# Altium footprint library ACTION_Connector.PcbLib: 123 footprints (part 6 of 8)
Each footprint in its own frame and in the unit in brackets; x right, y up, seen from the top. Pads: shape width x height; smd on the part's side, far side on the other; paste and mask are expansions set on the pad; w line width, h text height; cw(c..) or ccw(c..) is an arc to the next point about the centre after c.
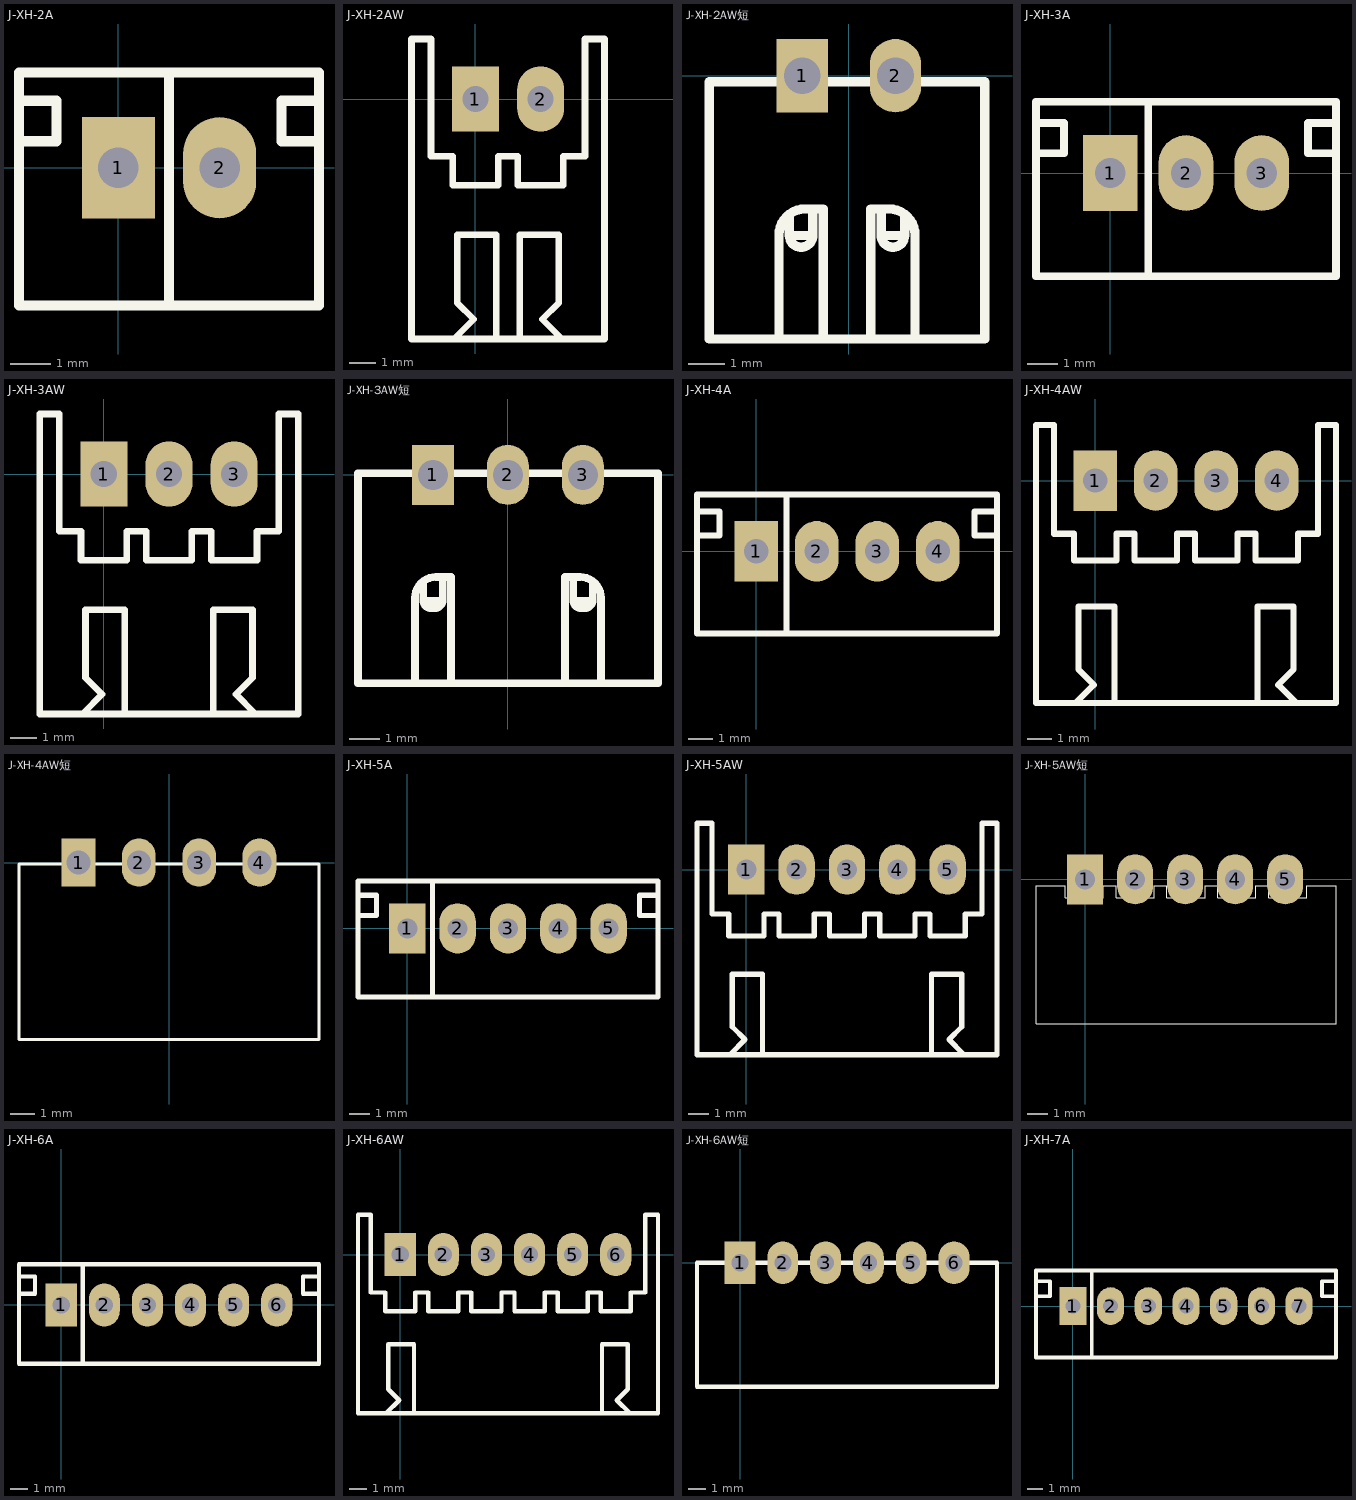
[diagram p5: the footprints below, top view; thin cyan lines are the x and y axes]

## J-XH-2A [mm]
pads (2):
  rect 1.8x2.5 hole 1: 1(0,0)
  oval 1.8x2.5 hole 1: 2(2.5,0)
Top Overlay:
  lines w0.254: -2.45,0.65 -1.524,0.65 -1.524,1.65 -2.45,1.65 ; 1.25,-3.4 1.25,2.35 ; 4.95,0.65 4.024,0.65 4.024,1.65 4.95,1.65 ; -2.45,-3.4 -2.45,2.35 4.95,2.35 4.95,-3.4 -2.45,-3.4
3D body "JST-B2B-XH-A.STEP": height 7, standoff -3.4, extent -2.45,-3.4 4.95,2.35

## J-XH-2AW [mm]
pads (2):
  rect 1.8x2.5 hole 1: 1(0,0)
  oval 1.8x2.5 hole 1: 2(2.5,0)
Top Overlay:
  lines w0.254: -0.79,-9.172 -0.064,-8.445 -0.7,-7.809 -0.7,-5.2 0.8,-5.2 0.8,-9.2 ; 1.7,-9.2 1.7,-5.2 3.2,-5.2 3.2,-7.809 2.564,-8.445 3.29,-9.172 ; -2.45,-9.2 4.95,-9.2 4.95,2.3 4.2,2.3 4.2,-2.2 3.375,-2.2 3.375,-3.3 1.625,-3.3 1.625,-2.2 0.875,-2.2 0.875,-3.3 -0.875,-3.3 -0.875,-2.2 -1.7,-2.2 -1.7,2.3 -2.45,2.3 -2.45,-9.2
3D body "JST-S2B-XH-A.STEP": height 6.1, standoff -3.4, extent -2.45,-9.2 4.95,2.3

## J-XH-2AW短 [mm]
pads (2):
  rect 1.4x2 hole 1: 1(-1.27,0)
  oval 1.4x2 hole 1: 2(1.27,0)
Top Overlay:
  lines w0.254: -1.62,-3.769 -1.62,-4.347 ; -0.98,-3.629 -0.98,-4.347 ; 0.88,-3.629 0.88,-4.347 ; 1.52,-3.769 1.52,-4.347 ; -1.9,-7.167 -1.9,-4.329 cw(c-1.2,-4.329) -1.2,-3.629 -0.7,-3.629 -0.7,-7.167 ; -1.9,-7.167 -3.8,-7.167 -3.8,-0.167 3.7,-0.167 3.7,-7.167 1.8,-7.167 ; -1.9,-7.167 -0.7,-7.167 ; -1.62,-4.347 ccw(c-1.3,-4.347) -0.98,-4.347 ; -1.62,-4.347 -0.98,-4.347 ; -0.7,-7.167 0.6,-7.167 ; 0.6,-7.167 0.6,-3.629 1.1,-3.629 cw(c1.1,-4.329) 1.8,-4.329 1.8,-7.167 ; 0.6,-7.167 1.8,-7.167 ; 0.88,-4.347 ccw(c1.2,-4.347) 1.52,-4.347 ; 0.88,-4.347 1.52,-4.347
3D body "User Library-JST-XH-2_5mm-2.STEP": height 5.95, standoff -3.35, extent -3.801,-7.305 3.699,0.335

## J-XH-3A [mm]
pads (3):
  rect 1.8x2.5 hole 1: 1(0,0)
  oval 1.8x2.5 hole 1: 2(2.5,0) 3(5,0)
Top Overlay:
  lines w0.254: -2.45,0.65 -1.524,0.65 -1.524,1.65 -2.45,1.65 ; 1.25,-3.4 1.25,2.35 ; 7.45,0.65 6.524,0.65 6.524,1.65 7.45,1.65 ; -2.45,-3.4 -2.45,2.35 7.45,2.35 7.45,-3.4 -2.45,-3.4
3D body "JST-B3B-XH-A.STEP": height 7, standoff -3.4, extent -2.45,-3.4 7.45,2.35

## J-XH-3AW [mm]
pads (3):
  rect 1.8x2.5 hole 1: 1(0,0)
  oval 1.8x2.5 hole 1: 2(2.5,0) 3(5,0)
Top Overlay:
  lines w0.254: -0.79,-9.172 -0.064,-8.445 -0.7,-7.809 -0.7,-5.2 0.8,-5.2 0.8,-9.2 ; 4.2,-9.2 4.2,-5.2 5.7,-5.2 5.7,-7.809 5.064,-8.445 5.79,-9.172 ; -2.45,-9.2 7.45,-9.2 7.45,2.3 6.7,2.3 6.7,-2.2 5.875,-2.2 5.875,-3.3 4.125,-3.3 4.125,-2.2 3.375,-2.2 3.375,-3.3 1.625,-3.3 1.625,-2.2 0.875,-2.2 0.875,-3.3 -0.875,-3.3 -0.875,-2.2 -1.7,-2.2 -1.7,2.3 -2.45,2.3 -2.45,-9.2
3D body "JST-S3B-XH-A.STEP": height 6.1, standoff -3.4, extent -2.45,-9.2 7.45,2.3

## J-XH-3AW短 [mm]
pads (3):
  rect 1.4x2 hole 1: 1(-2.5,0)
  oval 1.4x2 hole 1: 2(0,0) 3(2.5,0)
Top Overlay:
  lines w0.254: -2.815,-3.542 -2.815,-4.19 ; -2.175,-3.402 -2.175,-4.19 ; 2.185,-3.402 2.185,-4.19 ; 2.825,-3.542 2.825,-4.19 ; -3.095,-6.94 -1.895,-6.94 ; -3.095,-6.94 -4.995,-6.94 -4.995,0.06 5.005,0.06 5.005,-6.94 3.105,-6.94 ; -3.095,-6.94 -3.095,-4.102 cw(c-2.395,-4.102) -2.395,-3.402 -1.895,-3.402 -1.895,-6.94 ; -2.815,-4.19 ccw(c-2.565,-4.19) -2.565,-4.44 -2.425,-4.44 ccw(c-2.425,-4.19) -2.175,-4.19 ; -2.815,-4.19 -2.175,-4.19 ; -1.895,-6.94 1.905,-6.94 ; 1.905,-6.94 3.105,-6.94 ; 1.905,-6.94 1.905,-3.402 2.405,-3.402 cw(c2.405,-4.102) 3.105,-4.102 3.105,-6.94 ; 2.185,-4.19 ccw(c2.435,-4.19) 2.435,-4.44 2.575,-4.44 ccw(c2.575,-4.19) 2.825,-4.19 ; 2.185,-4.19 2.825,-4.19
3D body "User Library-JST-XH-2_5mm-3.STEP": height 5.95, standoff -3.35, extent -5,-7 5,0.64

## J-XH-4A [mm]
pads (4):
  rect 1.8x2.5 hole 1: 1(0,0)
  oval 1.8x2.5 hole 1: 2(2.5,0) 3(5,0) 4(7.5,0)
Top Overlay:
  lines w0.254: -2.45,0.65 -1.524,0.65 -1.524,1.65 -2.45,1.65 ; 1.25,-3.4 1.25,2.35 ; 9.95,0.65 9.024,0.65 9.024,1.65 9.95,1.65 ; -2.45,-3.4 -2.45,2.35 9.95,2.35 9.95,-3.4 -2.45,-3.4
3D body "JST-B4B-XH-A.STEP": height 7, standoff -3.4, extent -2.45,-3.4 9.95,2.35

## J-XH-4AW [mm]
pads (4):
  rect 1.8x2.5 hole 1: 1(0,0)
  oval 1.8x2.5 hole 1: 2(2.5,0) 3(5,0) 4(7.5,0)
Top Overlay:
  lines w0.254: -0.79,-9.172 -0.064,-8.445 -0.7,-7.809 -0.7,-5.2 0.8,-5.2 0.8,-9.2 ; 6.7,-9.2 6.7,-5.2 8.2,-5.2 8.2,-7.809 7.564,-8.445 8.29,-9.172 ; -2.45,-9.2 -2.45,2.3 -1.7,2.3 -1.7,-2.2 -0.875,-2.2 -0.875,-3.3 0.875,-3.3 0.875,-2.2 1.625,-2.2 1.625,-3.3 3.375,-3.3 3.375,-2.2 4.125,-2.2 4.125,-3.3 5.875,-3.3 5.875,-2.2 6.625,-2.2 6.625,-3.3 8.375,-3.3 8.375,-2.2 9.2,-2.2 9.2,2.3 9.95,2.3 9.95,-9.2 -2.45,-9.2
3D body "JST-S4B-XH-A.STEP": height 6.1, standoff -3.4, extent -2.45,-9.2 9.95,2.3

## J-XH-4AW短 [mm]
pads (4):
  rect 1.4x2 hole 1: 1(-3.75,0)
  oval 1.4x2 hole 1: 2(-1.25,0) 3(1.25,0) 4(3.75,0)
Top Overlay:
  lines w0.127: -6.223,-7.341 -6.223,-0.052 6.223,-0.052 6.223,-7.341 -6.223,-7.341
3D body "User Library-XH2_54-4P-AW.STEP": height 5.9, standoff -3, extent -6.147,-7.229 6.353,0.371

## J-XH-5A [mm]
pads (5):
  rect 1.8x2.5 hole 1: 1(0,0)
  oval 1.8x2.5 hole 1: 2(2.5,0) 3(5,0) 4(7.5,0) 5(10,0)
Top Overlay:
  lines w0.254: -2.45,0.65 -1.524,0.65 -1.524,1.65 -2.45,1.65 ; 1.25,-3.4 1.25,2.35 ; 12.45,0.65 11.524,0.65 11.524,1.65 12.45,1.65 ; -2.45,-3.4 12.45,-3.4 12.45,2.35 -2.45,2.35 -2.45,-3.4
3D body "JST-B5B-XH-A.STEP": height 7, standoff -3.4, extent -2.45,-3.4 12.45,2.35

## J-XH-5AW [mm]
pads (5):
  rect 1.8x2.5 hole 1: 1(0,0)
  oval 1.8x2.5 hole 1: 2(2.5,0) 3(5,0) 4(7.5,0) 5(10,0)
Top Overlay:
  lines w0.254: -0.79,-9.172 -0.064,-8.445 -0.7,-7.809 -0.7,-5.2 0.8,-5.2 0.8,-9.2 ; 9.2,-9.2 9.2,-5.2 10.7,-5.2 10.7,-7.809 10.064,-8.445 10.79,-9.172 ; -2.45,-9.2 -2.45,2.3 -1.7,2.3 -1.7,-2.2 -0.875,-2.2 -0.875,-3.3 0.875,-3.3 0.875,-2.2 1.625,-2.2 1.625,-3.3 3.375,-3.3 3.375,-2.2 4.125,-2.2 4.125,-3.3 5.875,-3.3 5.875,-2.2 6.625,-2.2 6.625,-3.3 8.375,-3.3 8.375,-2.2 9.125,-2.2 9.125,-3.3 10.875,-3.3 10.875,-2.2 11.7,-2.2 11.7,2.3 12.45,2.3 12.45,-9.2 -2.45,-9.2
3D body "JST-S5B-XH-A.STEP": height 6.1, standoff -3.4, extent -2.45,-9.2 12.45,2.3

## J-XH-5AW短 [mm]
pads (5):
  rect 1.8x2.5 hole 1: 1(0,0)
  oval 1.8x2.5 hole 1: 2(2.5,0) 3(5,0) 4(7.5,0) 5(10,0)
Top Overlay:
  lines w0.013: -0.291,-0.921 -0.291,-0.34 ; 0.209,-0.921 0.209,-0.34 ; 2.249,-0.921 2.249,-0.34 ; 2.749,-0.921 2.749,-0.34 ; 4.789,-0.921 4.789,-0.34 ; 5.289,-0.921 5.289,-0.34 ; 7.329,-0.921 7.329,-0.34 ; 7.829,-0.921 7.829,-0.34 ; 9.869,-0.921 9.869,-0.34 ; 10.369,-0.921 10.369,-0.34 ; -0.291,-0.34 -0.291,0.001 ; -0.291,-0.34 0.209,-0.34 ; -0.291,0.001 0.209,0.001 ; -0.291,0.001 -0.291,0.005 ; -0.291,0.005 0.209,0.005 ; -0.291,0.005 -0.291,0.505 0.209,0.505 0.209,0.005 ; 0.209,-0.34 0.209,0.001 ; 0.209,0.001 0.209,0.005 ; 2.249,-0.34 2.249,0.001 ; 2.249,-0.34 2.749,-0.34 ; 2.249,0.001 2.249,0.005 ; 2.249,0.001 2.749,0.001 ; 2.249,0.005 2.249,0.505 2.749,0.505 2.749,0.005 ; 2.249,0.005 2.749,0.005 ; 2.749,-0.34 2.749,0.001 ; 2.749,0.001 2.749,0.005 ; 4.789,-0.34 4.789,0.001 ; 4.789,-0.34 5.289,-0.34 ; 4.789,0.001 5.289,0.001 ; 4.789,0.001 4.789,0.005 ; 4.789,0.005 5.289,0.005 ; 4.789,0.005 4.789,0.505 5.289,0.505 5.289,0.005 ; 5.289,-0.34 5.289,0.001 ; 5.289,0.001 5.289,0.005 ; 7.329,-0.34 7.329,0.001 ; 7.329,-0.34 7.829,-0.34 ; 7.329,0.001 7.829,0.001 ; 7.329,0.001 7.329,0.005 ; 7.329,0.005 7.829,0.005 ; 7.329,0.005 7.329,0.505 7.829,0.505 7.829,0.005 ; 7.829,-0.34 7.829,0.001 ; 7.829,0.001 7.829,0.005 ; 9.869,-0.34 9.869,0.001 ; 9.869,-0.34 10.369,-0.34 ; 9.869,0.001 10.369,0.001 ; 9.869,0.001 9.869,0.005 ; 9.869,0.005 10.369,0.005 ; 9.869,0.005 9.869,0.505 10.369,0.505 10.369,0.005 ; 10.369,-0.34 10.369,0.001 ; 10.369,0.001 10.369,0.005 ; -2.461,-7.221 -2.461,-0.321 -0.991,-0.321 -0.991,-0.921 0.909,-0.921 0.909,-0.321 1.549,-0.321 1.549,-0.921 3.449,-0.921 3.449,-0.321 4.089,-0.321 4.089,-0.921 5.989,-0.921 5.989,-0.321 6.629,-0.321 6.629,-0.921 8.529,-0.921 8.529,-0.321 9.169,-0.321 9.169,-0.921 11.069,-0.921 11.069,-0.321 12.539,-0.321 12.539,-7.221 -2.461,-7.221
3D body "User Library-XH2_54-5P.STEP": height 5.71, standoff -1.54, extent -2.458,-7.179 12.542,0.546

## J-XH-6A [mm]
pads (6):
  rect 1.8x2.5 hole 1: 1(0,0)
  oval 1.8x2.5 hole 1: 2(2.5,0) 3(5,0) 4(7.5,0) 5(10,0) 6(12.5,0)
Top Overlay:
  lines w0.254: -2.45,0.65 -1.524,0.65 -1.524,1.65 -2.45,1.65 ; 1.25,-3.4 1.25,2.35 ; 14.95,0.65 14.024,0.65 14.024,1.65 14.95,1.65 ; -2.45,-3.4 14.95,-3.4 14.95,2.35 -2.45,2.35 -2.45,-3.4
3D body "JST-B6B-XH-A.STEP": height 7, standoff -3.4, extent -2.45,-3.4 14.95,2.35

## J-XH-6AW [mm]
pads (6):
  rect 1.8x2.5 hole 1: 1(0,0)
  oval 1.8x2.5 hole 1: 2(2.5,0) 3(5,0) 4(7.5,0) 5(10,0) 6(12.5,0)
Top Overlay:
  lines w0.254: -0.79,-9.172 -0.064,-8.445 -0.7,-7.809 -0.7,-5.2 0.8,-5.2 0.8,-9.2 ; 11.7,-9.2 11.7,-5.2 13.2,-5.2 13.2,-7.809 12.564,-8.445 13.29,-9.172 ; -2.45,-9.2 14.95,-9.2 14.95,2.3 14.2,2.3 14.2,-2.2 13.375,-2.2 13.375,-3.3 11.625,-3.3 11.625,-2.2 10.875,-2.2 10.875,-3.3 9.125,-3.3 9.125,-2.2 8.375,-2.2 8.375,-3.3 6.625,-3.3 6.625,-2.2 5.875,-2.2 5.875,-3.3 4.125,-3.3 4.125,-2.2 3.375,-2.2 3.375,-3.3 1.625,-3.3 1.625,-2.2 0.875,-2.2 0.875,-3.3 -0.875,-3.3 -0.875,-2.2 -1.7,-2.2 -1.7,2.3 -2.45,2.3 -2.45,-9.2
3D body "JST-S6B-XH-A.STEP": height 6.1, standoff -3.4, extent -2.45,-9.2 14.95,2.3

## J-XH-6AW短 [mm]
pads (6):
  rect 1.8x2.5 hole 1: 1(0,0)
  oval 1.8x2.5 hole 1: 2(2.5,0) 3(5,0) 4(7.5,0) 5(10,0) 6(12.5,0)
Top Overlay:
  lines w0.254: -2.515,-7.239 15.011,-7.239 15.011,0 -2.515,0 -2.515,-7.239
3D body "User Library-JST-XH-2_5mm-6.STEP": height 5.95, standoff -3.35, extent -2.489,-7.249 15.011,0.391

## J-XH-7A [mm]
pads (7):
  rect 1.8x2.5 hole 1: 1(0,0)
  oval 1.8x2.5 hole 1: 2(2.5,0) 3(5,0) 4(7.5,0) 5(10,0) 6(12.5,0) 7(15,0)
Top Overlay:
  lines w0.254: -2.45,0.65 -1.524,0.65 -1.524,1.65 -2.45,1.65 ; 1.25,-3.4 1.25,2.35 ; 17.45,0.65 16.524,0.65 16.524,1.65 17.45,1.65 ; -2.45,-3.4 17.45,-3.4 17.45,2.35 -2.45,2.35 -2.45,-3.4
3D body "JST-B7B-XH-A.STEP": height 7, standoff -3.4, extent -2.45,-3.4 17.45,2.35